# Altium footprint library Connectors.PcbLib: 164 footprints (part 4 of 11)
Each footprint in its own frame and in the unit in brackets; x right, y up, seen from the top. Pads: shape width x height; smd on the part's side, far side on the other; paste and mask are expansions set on the pad; w line width, h text height; cw(c..) or ccw(c..) is an arc to the next point about the centre after c.
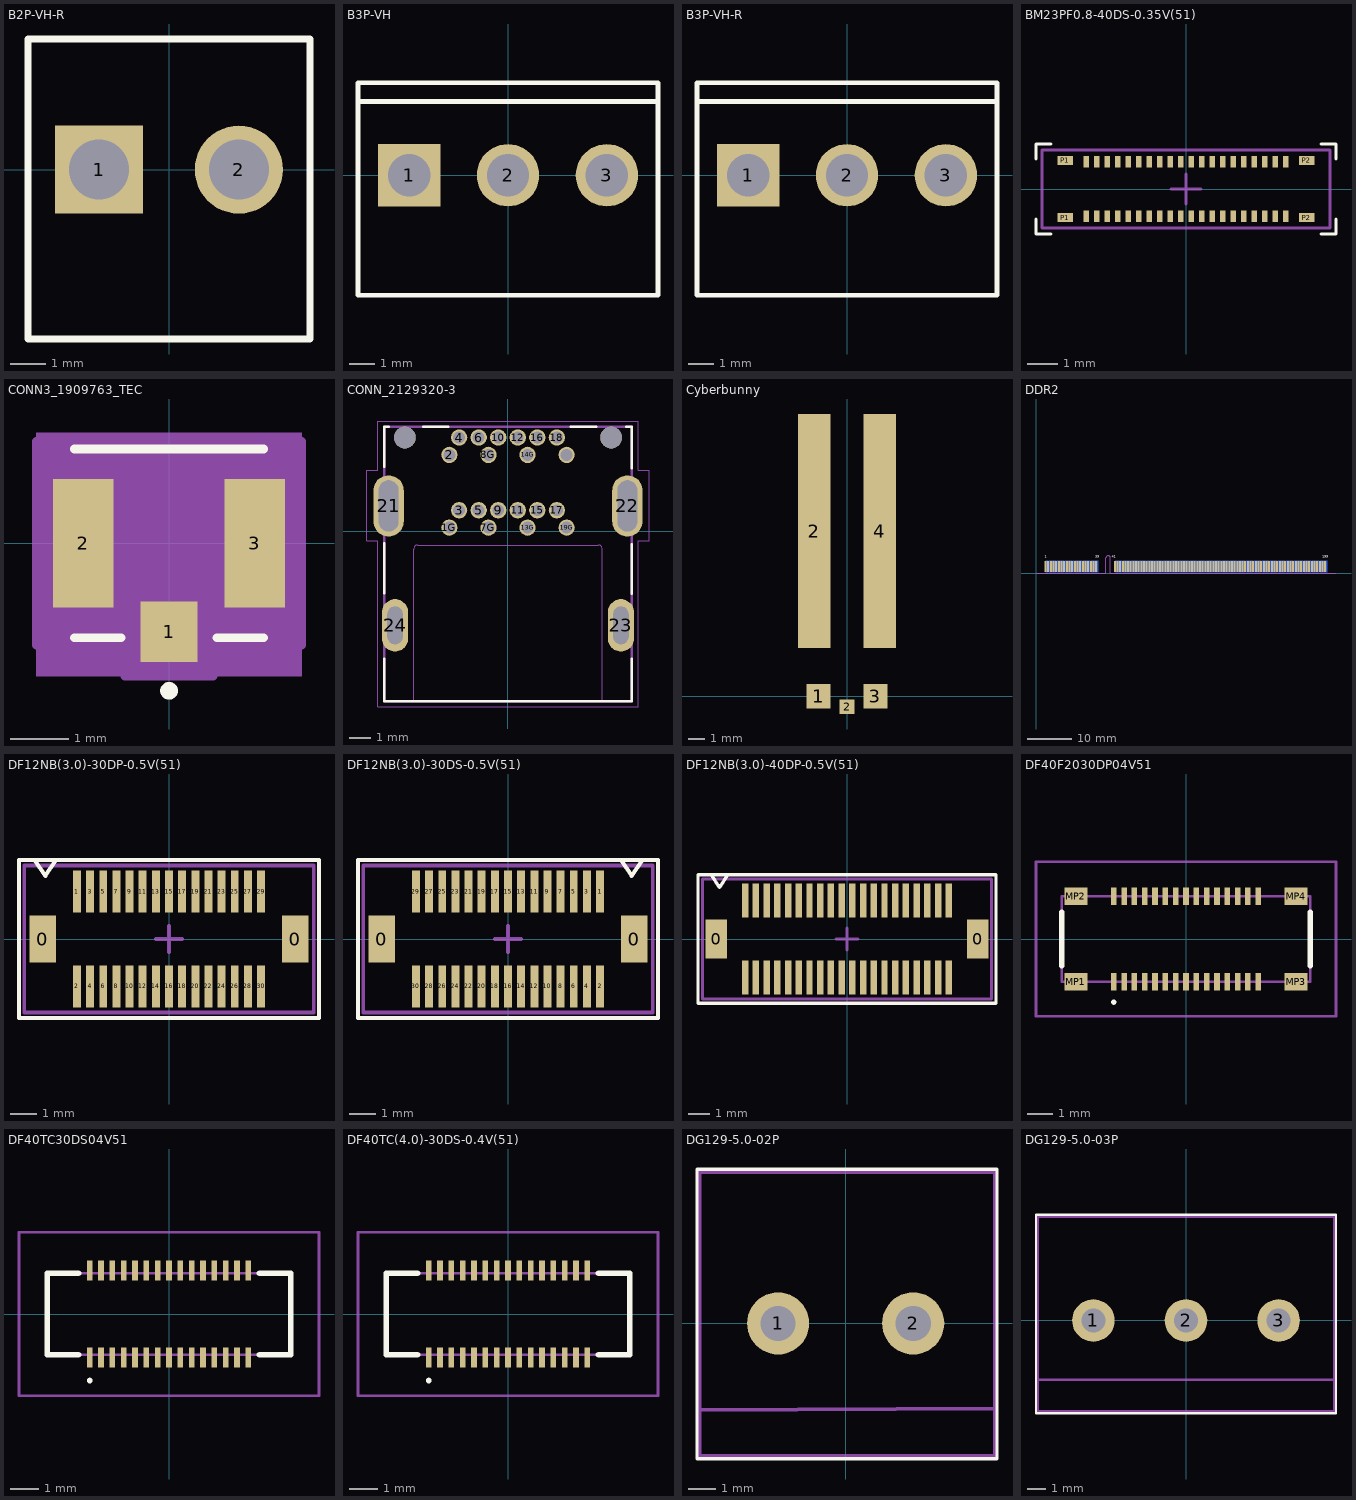
[diagram p3: the footprints below, top view; thin cyan lines are the x and y axes]

## B2P-VH-R [mm]
height 11
pads (2):
  rect 2.5x2.5 hole 1.7: 1(-1.98,0)
  round 2.5 hole 1.7: 2(1.98,0)
Top Overlay:
  lines w0.2: -4,-4.8 4,-4.8 4,3.7 -4,3.7 -4,-4.8
3D body "User Library-B2P-VH-R.STEP": height 10.9, standoff -3.7, extent -3.93,-4.6 3.93,3.9

## B3P-VH [mm]
height 11
pads (3):
  rect 2.5x2.5 hole 1.7: 1(-3.96,0)
  round 2.5 hole 1.7: 2(0,0) 3(3.96,0)
Top Overlay:
  lines w0.2: -6,2.95 6,2.95 ; -6,-4.8 -6,3.7 6,3.7 6,-4.8 -6,-4.8
3D body "User Library-B3P-VH.STEP": height 10.9, standoff -3.7, extent -5.91,-4.55 5.91,3.95

## B3P-VH-R [mm]
pads (3):
  rect 2.5x2.5 hole 1.7: 1(-3.96,0)
  round 2.5 hole 1.7: 2(0,0) 3(3.96,0)
Top Overlay:
  lines w0.2: -6,2.95 6,2.95 ; -6,-4.8 -6,3.7 6,3.7 6,-4.8 -6,-4.8
3D body "User Library-B3P-VH-R.STEP": height 10.9, standoff -3.7, extent -5.91,-4.55 5.91,3.95

## BM23PF0.8-40DS-0.35V(51) [mm]
height 0.8
pads (44):
  rect 0.18x0.38 smd mask+0.1: 1(-3.325,0.91) 2(-3.325,-0.91) 3(-2.975,0.91) 4(-2.975,-0.91) 5(-2.625,0.91) 6(-2.625,-0.91) 7(-2.275,0.91) 8(-2.275,-0.91) 9(-1.925,0.91) 10(-1.925,-0.91) 11(-1.575,0.91) 12(-1.575,-0.91) 13(-1.225,0.91) 14(-1.225,-0.91) 15(-0.875,0.91) 16(-0.875,-0.91) 17(-0.525,0.91) 18(-0.525,-0.91) 19(-0.175,0.91) 20(-0.175,-0.91) 21(0.175,0.91) 22(0.175,-0.91) 23(0.525,0.91) 24(0.525,-0.91) 25(0.875,0.91) 26(0.875,-0.91) 27(1.225,0.91) 28(1.225,-0.91) 29(1.575,0.91) 30(1.575,-0.91) 31(1.925,0.91) 32(1.925,-0.91) 33(2.275,0.91) 34(2.275,-0.91) 35(2.625,0.91) 36(2.625,-0.91) 37(2.975,0.91) 38(2.975,-0.91) 39(3.325,0.91) 40(3.325,-0.91)
  rect 0.52x0.3 smd: P1(-4.03,-0.95) P1(-4.03,0.95) P2(4.03,-0.95) P2(4.03,0.95)
Top Overlay:
  lines w0.1: -5,-1 -5,-1.5 -4.5,-1.5 ; -5,1 -5,1.5 -4.5,1.5 ; 4.5,-1.5 5,-1.5 5,-1 ; 4.5,1.5 5,1.5 5,1
Mechanical 13:
  lines w0.1: -0.5,0 0.5,0 ; 0,-0.5 0,0.5 ; -4.8,-1.3 -4.8,1.3 4.8,1.3 4.8,-1.3 -4.8,-1.3
3D body "BM23PF0.8-40DS-0.35V(51)_4800369051_3dstep.stp": height 0.79, standoff -0.01, extent -4.75,-0.995 4.75,0.985

## CONN3_1909763_TEC [mil]
height 49.21
pads (3):
  rect 39x41 smd paste+0 mask+0: 1(0,-59.87)
  rect 41x87 smd paste+0 mask+0: 2(-58.24,0) 3(58.24,0)
Top Overlay:
  circle w6: c0,-100 r3
  lines w6: -64.06,-64.06 -32.6,-64.06 ; -64.06,64.06 64.06,64.06 ; 32.6,-64.06 64.06,-64.06
Mechanical 5:
  region: 90,-90 -90,-90 -90,75 90,75
Mechanical 13:
  circle w0: c0,-35 r3
  lines w1: -19.68,-59.06 -59.06,-59.06 ; -19.68,59.06 -59.06,59.06 ; 19.68,-59.06 59.06,-59.06 ; 19.68,59.06 59.06,59.06 ; -59.06,-59.06 -59.06,59.06 ; -59.06,-59.06 59.06,-59.06 ; -59.06,-59.06 -59.06,59.06 ; -59.06,59.06 59.06,59.06 ; 59.06,-59.06 59.06,59.06 ; 59.06,-59.06 59.06,59.06
Mechanical 15:
  region: -30,-69.06 -90,-69.06 -90,69.06 90,69.06 90,-69.06 30,-69.06 30,-90 -30,-90
  region: 59.06,-59.06 -59.06,-59.06 -59.06,59.06 59.06,59.06
  lines w6: -90,-69.06 -30,-69.06 -30,-90 30,-90 30,-69.06 90,-69.06 90,69.06 -90,69.06 -90,-69.06
3D body "User Library-1909763-1.step": height 49.21, standoff -1.18, extent -59.05,-61.02 59.06,51.19

## CONN_2129320-3 [mm] "DisplayPort, Mini Receptacle Connector 20 Position Through Hole, Right Angle"
pads (30):
  round 0.75 hole 0.55: 1G(-2.7,0.175) 2(-2.7,3.525) 3(-2.25,0.975) 4(-2.25,4.325) 5(-1.35,0.975) 6(-1.35,4.325) 7G(-0.9,0.175) 8G(-0.9,3.525) 9(-0.45,0.975) 10(-0.45,4.325) 11(0.45,0.975) 12(0.45,4.325) 13G(0.9,0.175) 14G(0.9,3.525) 15(1.35,0.975) 16(1.35,4.325) 17(2.25,0.975) 18(2.25,4.325) 19G(2.7,0.175) 20_POWER(2.7,3.525)
  oval 1.408x2.816 hole 0.9 slot 2.35 at 90 deg: 21(-5.5,1.175) 22(5.5,1.175)
  oval 1.208x2.416 hole 0.7 slot 1.74 at 90 deg: 23(5.2,-4.325) 24(-5.2,-4.325)
  round 0.9 hole 0.9 unplated: ""(-5.5,1.175) ""(5.5,1.175)
  round 0.7 hole 0.7 unplated: ""(-5.2,-4.325) ""(5.2,-4.325)
  round 1 hole 1 unplated: ""(-4.75,4.325) ""(4.75,4.325)
Top Overlay:
  lines w0.127: -5.7,-5.875 -5.7,-7.825 5.7,-7.825 5.7,-5.875 ; -5.7,-2.835 -5.7,-0.555 ; -5.7,2.975 -5.7,4.825 -5.5,4.825 ; -3.9,4.825 -2.75,4.825 ; 2.9,4.825 4.05,4.825 ; 5.45,4.825 5.7,4.825 5.7,2.925 ; 5.7,-2.865 5.7,-0.585
Mechanical 1:
  lines w0: -4.35,-7.825 -4.35,-0.825 cw(c-4.15,-0.825) -4.15,-0.625 4.15,-0.625 cw(c4.15,-0.825) 4.35,-0.825 4.35,-7.825
Mechanical 13:
  lines w0.127: -5.7,-7.825 -5.7,4.825 5.7,4.825 5.7,-7.825 -5.7,-7.825
Mechanical 15:
  lines w0.05: -6.5,-0.425 -6.5,2.825 -6,2.825 -6,5.075 6,5.075 6,2.825 6.5,2.825 6.5,-0.425 6,-0.425 6,-8.075 -6,-8.075 -6,-0.425 -6.5,-0.425
3D body "c-2129320-3-b-3d.stp": height 4.23, standoff -2.17, extent -5.7,-7.825 5.7,4.825

## Cyberbunny [mm]
pads (5):
  rect 1.5x1.5 smd: 1(-1.75,0) 3(1.75,0)
  rect 2x14.4 smd: 2(-2,10.15) 4(2,10.15)
  rect 0.9x0.9 smd: 2(0,-0.65)

## DDR2 [mm]
pads (200):
  rect 0.45x2.55 smd: 1(2.15,1.575) 3(2.75,1.575) 5(3.35,1.575) 7(3.95,1.575) 9(4.55,1.575) 11(5.15,1.575) 13(5.75,1.575) 15(6.35,1.575) 17(6.95,1.575) 19(7.55,1.575) 21(8.15,1.575) 23(8.75,1.575) 25(9.35,1.575) 27(9.95,1.575) 29(10.55,1.575) 31(11.15,1.575) 33(11.75,1.575) 35(12.35,1.575) 37(12.95,1.575) 39(13.55,1.575) 41(17.75,1.575) 43(18.35,1.575) 45(18.95,1.575) 47(19.55,1.575) 49(20.15,1.575) 51(20.75,1.575) 53(21.35,1.575) 55(21.95,1.575) 57(22.55,1.575) 59(23.15,1.575) 61(23.75,1.575) 63(24.35,1.575) 65(24.95,1.575) 67(25.55,1.575) 69(26.15,1.575) 71(26.75,1.575) 73(27.35,1.575) 75(27.95,1.575) 77(28.55,1.575) 79(29.15,1.575) 81(29.75,1.575) 83(30.35,1.575) 85(30.95,1.575) 87(31.55,1.575) 89(32.15,1.575) 91(32.75,1.575) 93(33.35,1.575) 95(33.95,1.575) 97(34.55,1.575) 99(35.15,1.575) 101(35.75,1.575) 103(36.35,1.575) 105(36.95,1.575) 107(37.55,1.575) 109(38.15,1.575) 111(38.75,1.575) 113(39.35,1.575) 115(39.95,1.575) 117(40.55,1.575) 119(41.15,1.575) 121(41.75,1.575) 123(42.35,1.575) 125(42.95,1.575) 127(43.55,1.575) 129(44.15,1.575) 131(44.75,1.575) 133(45.35,1.575) 135(45.95,1.575) 137(46.55,1.575) 139(47.15,1.575) 141(47.75,1.575) 143(48.35,1.575) 145(48.95,1.575) 147(49.55,1.575) 149(50.15,1.575) 151(50.75,1.575) 153(51.35,1.575) 155(51.95,1.575) 157(52.55,1.575) 159(53.15,1.575) 161(53.75,1.575) 163(54.35,1.575) 165(54.95,1.575) 167(55.55,1.575) 169(56.15,1.575) 171(56.75,1.575) 173(57.35,1.575) 175(57.95,1.575) 177(58.55,1.575) 179(59.15,1.575) 181(59.75,1.575) 183(60.35,1.575) 185(60.95,1.575) 187(61.55,1.575) 189(62.15,1.575) 191(62.75,1.575) 193(63.35,1.575) 195(63.95,1.575) 197(64.55,1.575) 199(65.15,1.575)
  rect 0.45x2.55 smd far side: 2(2.45,1.575) 4(3.05,1.575) 6(3.65,1.575) 8(4.25,1.575) 10(4.85,1.575) 12(5.45,1.575) 14(6.05,1.575) 16(6.65,1.575) 18(7.25,1.575) 20(7.85,1.575) 22(8.45,1.575) 24(9.05,1.575) 26(9.65,1.575) 28(10.25,1.575) 30(10.85,1.575) 32(11.45,1.575) 34(12.05,1.575) 36(12.65,1.575) 38(13.25,1.575) 40(13.85,1.575) 42(18.05,1.575) 44(18.65,1.575) 46(19.25,1.575) 48(19.85,1.575) 50(20.45,1.575) 52(21.05,1.575) 54(21.65,1.575) 56(22.25,1.575) 58(22.85,1.575) 60(23.45,1.575) 62(24.05,1.575) 64(24.65,1.575) 66(25.25,1.575) 68(25.85,1.575) 70(26.45,1.575) 72(27.05,1.575) 74(27.65,1.575) 76(28.25,1.575) 78(28.85,1.575) 80(29.45,1.575) 82(30.05,1.575) 84(30.65,1.575) 86(31.25,1.575) 88(31.85,1.575) 90(32.45,1.575) 92(33.05,1.575) 94(33.65,1.575) 96(34.25,1.575) 98(34.85,1.575) 100(35.45,1.575) 102(36.05,1.575) 104(36.65,1.575) 106(37.25,1.575) 108(37.85,1.575) 110(38.45,1.575) 112(39.05,1.575) 114(39.65,1.575) 116(40.25,1.575) 118(40.85,1.575) 120(41.45,1.575) 122(42.05,1.575) 124(42.65,1.575) 126(43.25,1.575) 128(43.85,1.575) 130(44.45,1.575) 132(45.05,1.575) 134(45.65,1.575) 136(46.25,1.575) 138(46.85,1.575) 140(47.45,1.575) 142(48.05,1.575) 144(48.65,1.575) 146(49.25,1.575) 148(49.85,1.575) 150(50.45,1.575) 152(51.05,1.575) 154(51.65,1.575) 156(52.25,1.575) 158(52.85,1.575) 160(53.45,1.575) 162(54.05,1.575) 164(54.65,1.575) 166(55.25,1.575) 168(55.85,1.575) 170(56.45,1.575) 172(57.05,1.575) 174(57.65,1.575) 176(58.25,1.575) 178(58.85,1.575) 180(59.45,1.575) 182(60.05,1.575) 184(60.65,1.575) 186(61.25,1.575) 188(61.85,1.575) 190(62.45,1.575) 192(63.05,1.575) 194(63.65,1.575) 196(64.25,1.575) 198(64.85,1.575) 200(65.45,1.575)
Top Overlay:
  text "199" at 64.55,3.275 h1
  text "41" at 17.05,3.275 h1
  text "39" at 13.35,3.275 h1
  text "1" at 1.95,3.275 h1
Bottom Overlay:
  text "200" at 64.95,3.275 h1
  text "42" at 17.55,3.275 h1
  text "40" at 13.45,3.275 h1
  text "2" at 2.25,3.275 h1
Mechanical 15:
  lines w0.1: 0,0 15.75,0 15.75,3.5 cw(c16.25,3.5) 16.75,3.5 16.75,0 67.6,0

## DF12NB(3.0)-30DP-0.5V(51) [mm]
pads (32):
  rect 1x1.8 smd: 0(-4.8,0) 0(4.8,0)
  rect 0.3x1.6 smd: 1(-3.5,1.8) 2(-3.5,-1.8) 3(-3,1.8) 4(-3,-1.8) 5(-2.5,1.8) 6(-2.5,-1.8) 7(-2,1.8) 8(-2,-1.8) 9(-1.5,1.8) 10(-1.5,-1.8) 11(-1,1.8) 12(-1,-1.8) 13(-0.5,1.8) 14(-0.5,-1.8) 15(0,1.8) 16(0,-1.8) 17(0.5,1.8) 18(0.5,-1.8) 19(1,1.8) 20(1,-1.8) 21(1.5,1.8) 22(1.5,-1.8) 23(2,1.8) 24(2,-1.8) 25(2.5,1.8) 26(2.5,-1.8) 27(3,1.8) 28(3,-1.8) 29(3.5,1.8) 30(3.5,-1.8)
Top Overlay:
  lines w0.15: -5.1,3 -4.7,2.4 -4.3,3 ; -5.7,-3 -5.7,3 5.7,3 5.7,-3 -5.7,-3
Mechanical 13:
  lines w0.15: -0.5,0 0.5,0 ; 0,-0.5 0,0.5 ; -5.5,-2.8 5.5,-2.8 5.5,2.8 -5.5,2.8 -5.5,-2.8
3D body "DF12NB(3.0)-30DP.stp": height 2.3, standoff 0, extent -5.3,-2.3 5.3,2.3

## DF12NB(3.0)-30DS-0.5V(51) [mm]
pads (32):
  rect 1x1.8 smd: 0(-4.8,0) 0(4.8,0)
  rect 0.3x1.6 smd: 1(3.5,1.8) 2(3.5,-1.8) 3(3,1.8) 4(3,-1.8) 5(2.5,1.8) 6(2.5,-1.8) 7(2,1.8) 8(2,-1.8) 9(1.5,1.8) 10(1.5,-1.8) 11(1,1.8) 12(1,-1.8) 13(0.5,1.8) 14(0.5,-1.8) 15(0,1.8) 16(0,-1.8) 17(-0.5,1.8) 18(-0.5,-1.8) 19(-1,1.8) 20(-1,-1.8) 21(-1.5,1.8) 22(-1.5,-1.8) 23(-2,1.8) 24(-2,-1.8) 25(-2.5,1.8) 26(-2.5,-1.8) 27(-3,1.8) 28(-3,-1.8) 29(-3.5,1.8) 30(-3.5,-1.8)
Top Overlay:
  lines w0.15: 4.3,3 4.7,2.4 5.1,3 ; -5.7,-3 5.7,-3 5.7,3 -5.7,3 -5.7,-3
Mechanical 13:
  lines w0.15: -0.5,0 0.5,0 ; 0,-0.5 0,0.5 ; -5.5,-2.8 -5.5,2.8 5.5,2.8 5.5,-2.8 -5.5,-2.8
3D body "DF12NB(3.0)-30DS.stp": height 2.2, standoff 0, extent -5.3,-2.3 5.3,2.3

## DF12NB(3.0)-40DP-0.5V(51) [mm]
pads (42):
  rect 1x1.8 smd: 0(-6.1,0) 0(6.1,0)
  rect 0.3x1.6 smd: 1(-4.75,1.8) 2(-4.75,-1.8) 3(-4.25,1.8) 4(-4.25,-1.8) 5(-3.75,1.8) 6(-3.75,-1.8) 7(-3.25,1.8) 8(-3.25,-1.8) 9(-2.75,1.8) 10(-2.75,-1.8) 11(-2.25,1.8) 12(-2.25,-1.8) 13(-1.75,1.8) 14(-1.75,-1.8) 15(-1.25,1.8) 16(-1.25,-1.8) 17(-0.75,1.8) 18(-0.75,-1.8) 19(-0.25,1.8) 20(-0.25,-1.8) 21(0.25,1.8) 22(0.25,-1.8) 23(0.75,1.8) 24(0.75,-1.8) 25(1.25,1.8) 26(1.25,-1.8) 27(1.75,1.8) 28(1.75,-1.8) 29(2.25,1.8) 30(2.25,-1.8) 31(2.75,1.8) 32(2.75,-1.8) 33(3.25,1.8) 34(3.25,-1.8) 35(3.75,1.8) 36(3.75,-1.8) 37(4.25,1.8) 38(4.25,-1.8) 39(4.75,1.8) 40(4.75,-1.8)
Top Overlay:
  lines w0.15: -6.35,3 -5.95,2.4 -5.55,3 ; -6.95,-3 -6.95,3 6.95,3 6.95,-3 -6.95,-3
Mechanical 13:
  lines w0.15: -0.5,0 0.5,0 ; 0,-0.5 0,0.5 ; -6.75,-2.8 6.75,-2.8 6.75,2.8 -6.75,2.8 -6.75,-2.8
3D body "DF12NB(3.0)-40DP.stp": height 2.3, standoff 0, extent -6.55,-2.3 6.55,2.3

## DF40F2030DP04V51 [mm]
pads (34):
  rect 0.22x0.68 smd: 1(-2.8,-1.65) 2(-2.8,1.65) 3(-2.4,-1.65) 4(-2.4,1.65) 5(-2,-1.65) 6(-2,1.65) 7(-1.6,-1.65) 8(-1.6,1.65) 9(-1.2,-1.65) 10(-1.2,1.65) 11(-0.8,-1.65) 12(-0.8,1.65) 13(-0.4,-1.65) 14(-0.4,1.65) 15(0,-1.65) 16(0,1.65) 17(0.4,-1.65) 18(0.4,1.65) 19(0.8,-1.65) 20(0.8,1.65) 21(1.2,-1.65) 22(1.2,1.65) 23(1.6,-1.65) 24(1.6,1.65) 25(2,-1.65) 26(2,1.65) 27(2.4,-1.65) 28(2.4,1.65) 29(2.8,-1.65) 30(2.8,1.65)
  rect 0.88x0.68 smd: MP1(-4.265,-1.65) MP2(-4.265,1.65) MP3(4.265,-1.65) MP4(4.265,1.65)
Top Overlay:
  lines w0.1: -2.8,-2.5 ccw(c-2.8,-2.45) -2.8,-2.4 ccw(c-2.8,-2.45) -2.8,-2.5
  lines w0.2: -4.815,-1.037 -4.815,0.83 -4.815,1.038 ; 4.815,-1.037 4.815,1.038
Mechanical 15:
  lines w0.1: -4.815,-1.66 -4.815,1.66 4.815,1.66 4.815,-1.66 -4.815,-1.66
Mechanical 20:
  lines w0.1: -5.815,-2.99 -5.815,2.99 5.815,2.99 5.815,-2.99 -5.815,-2.99
3D body "WNCB-2300612.stp": height 3.15, standoff 0, extent -4.82,-1.85 4.81,1.83

## DF40TC30DS04V51 [mm]
pads (30):
  rect 0.2x0.7 smd: 1(-2.8,-1.54) 2(-2.8,1.54) 3(-2.4,-1.54) 4(-2.4,1.54) 5(-2,-1.54) 6(-2,1.54) 7(-1.6,-1.54) 8(-1.6,1.54) 9(-1.2,-1.54) 10(-1.2,1.54) 11(-0.8,-1.54) 12(-0.8,1.54) 13(-0.4,-1.54) 14(-0.4,1.54) 15(0,-1.54) 16(0,1.54) 17(0.4,-1.54) 18(0.4,1.54) 19(0.8,-1.54) 20(0.8,1.54) 21(1.2,-1.54) 22(1.2,1.54) 23(1.6,-1.54) 24(1.6,1.54) 25(2,-1.54) 26(2,1.54) 27(2.4,-1.54) 28(2.4,1.54) 29(2.8,-1.54) 30(2.8,1.54)
Top Overlay:
  lines w0.1: -2.8,-2.4 ccw(c-2.8,-2.35) -2.8,-2.3 ccw(c-2.8,-2.35) -2.8,-2.4
  lines w0.2: -3.2,-1.44 -4.3,-1.44 -4.3,1.44 -3.2,1.44 ; 3.2,-1.44 4.3,-1.44 4.3,1.44 3.2,1.44
Mechanical 15:
  lines w0.1: -4.3,-1.44 4.3,-1.44 4.3,1.44 -4.3,1.44 -4.3,-1.44
Mechanical 20:
  lines w0.1: -5.3,-2.89 5.3,-2.89 5.3,2.89 -5.3,2.89 -5.3,-2.89

## DF40TC(4.0)-30DS-0.4V(51) [mm]
pads (30):
  rect 0.2x0.7 smd: 1(-2.8,-1.54) 2(-2.8,1.54) 3(-2.4,-1.54) 4(-2.4,1.54) 5(-2,-1.54) 6(-2,1.54) 7(-1.6,-1.54) 8(-1.6,1.54) 9(-1.2,-1.54) 10(-1.2,1.54) 11(-0.8,-1.54) 12(-0.8,1.54) 13(-0.4,-1.54) 14(-0.4,1.54) 15(0,-1.54) 16(0,1.54) 17(0.4,-1.54) 18(0.4,1.54) 19(0.8,-1.54) 20(0.8,1.54) 21(1.2,-1.54) 22(1.2,1.54) 23(1.6,-1.54) 24(1.6,1.54) 25(2,-1.54) 26(2,1.54) 27(2.4,-1.54) 28(2.4,1.54) 29(2.8,-1.54) 30(2.8,1.54)
Top Overlay:
  lines w0.1: -2.8,-2.4 ccw(c-2.8,-2.35) -2.8,-2.3 ccw(c-2.8,-2.35) -2.8,-2.4
  lines w0.2: -3.2,-1.44 -4.3,-1.44 -4.3,1.44 -3.2,1.44 ; 3.2,-1.44 4.3,-1.44 4.3,1.44 3.2,1.44
Mechanical 15:
  lines w0.1: -4.3,-1.44 4.3,-1.44 4.3,1.44 -4.3,1.44 -4.3,-1.44
Mechanical 20:
  lines w0.1: -5.3,-2.89 5.3,-2.89 5.3,2.89 -5.3,2.89 -5.3,-2.89
3D body "WNCB-2100086.stp": height 3.9, standoff 0, extent -4.31,-1.68 4.29,1.7

## DG129-5.0-02P [mm]
height 19.5
pads (2):
  round 2.3 hole 1.3: 1(-2.5,0) 2(2.5,0)
Top Overlay:
  lines w0.127: -5.5,-5 5.6,-5 5.6,5.7 -5.5,5.7 -5.5,-5
Mechanical 15:
  lines w0.15: -5.4,-3.2 5.5,-3.148 ; -5.4,-4.9 5.528,-4.9 5.528,5.6 -5.4,5.6 -5.4,-4.9
3D body "DG129-5.0-02P-1Y-100AH.STEP": height 19.55, standoff -3.9, extent -5.55,-4.9 5.55,5.6

## DG129-5.0-03P [mm]
height 19.5
pads (3):
  round 2.3 hole 1.3: 1(-5,0) 2(0,0) 3(5,0)
Top Overlay:
  lines w0.127: -8.1,-5 8.1,-5 8.1,5.7 -8.1,5.7 -8.1,-5
Mechanical 15:
  lines w0.15: -8,-3.2 8,-3.2 ; -8,-4.9 -8,5.6 8,5.6 8,-4.9 -8,-4.9
3D body "DG129-5.0-03P-1Y-100AH.STEP": height 19.55, standoff -3.9, extent -8.05,-4.9 8.05,5.6